# Altium footprint library THU.PcbLib: 477 footprints (part 14 of 30)
Each footprint in its own frame and in the unit in brackets; x right, y up, seen from the top. Pads: shape width x height; smd on the part's side, far side on the other; paste and mask are expansions set on the pad; w line width, h text height; cw(c..) or ccw(c..) is an arc to the next point about the centre after c.
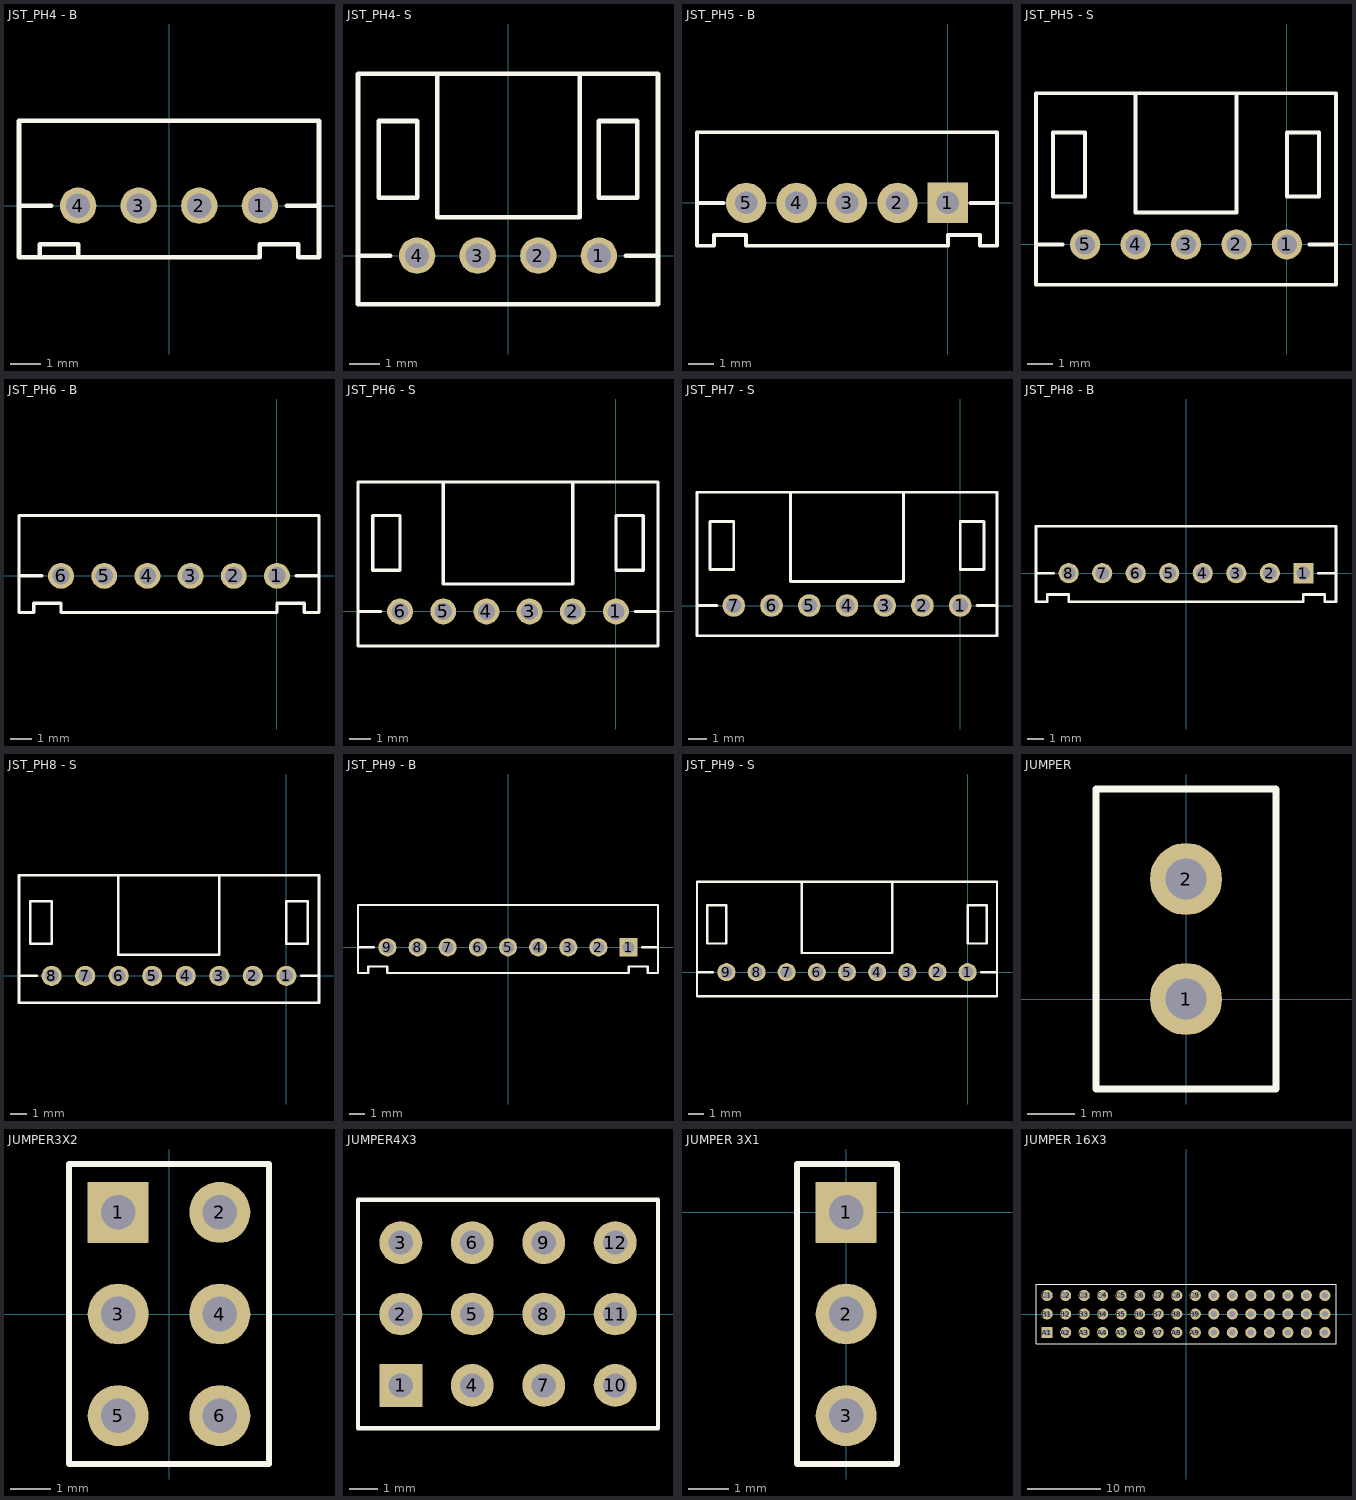
[diagram p13: the footprints below, top view; thin cyan lines are the x and y axes]

## JST_PH4 - B [mm] "B 4B-PH-K-S"
pads (4):
  round 1.2 hole 0.8: 1(3,0) 2(1,0) 3(-1,0) 4(-3,0)
TopOverlay:
  lines w0.152: -4.95,0 -3.889,0 ; -4.27,-1.7 -4.27,-1.27 -3,-1.27 -3,-1.7 ; 3.889,0 4.95,0 ; -4.95,-1.7 3,-1.7 3,-1.27 4.27,-1.27 4.27,-1.7 4.95,-1.7 4.95,2.8 -4.95,2.8 -4.95,-1.7
3D body "B4B-PH-K-S.STEP": height 6, standoff -3.4, extent -4.95,-1.706 4.95,2.794

## JST_PH4- S [mm] "S 4B-PH-K-S"
height 4.5
pads (4):
  round 1.2 hole 0.8: 1(3,0) 2(1,0) 3(-1,0) 4(-3,0)
TopOverlay:
  lines w0.152: -4.95,0 -3.889,0 ; -2.334,6 -2.334,1.27 2.365,1.27 2.365,6 ; 3.889,0 4.95,0 ; -4.95,-1.6 -4.95,6 4.95,6 4.95,-1.6 -4.95,-1.6 ; -4.27,1.905 -3,1.905 -3,4.445 -4.27,4.445 -4.27,1.905 ; 3,1.905 4.27,1.905 4.27,4.445 3,4.445 3,1.905
3D body "S4B-PH-K-S.STEP": height 4.82, standoff -3.37, extent -4.95,-1.35 4.95,6.25

## JST_PH5 - B [mm] "B 5B-PH-K-S"
height 6
pads (5):
  rect 1.6x1.6 hole 0.9: 1(0,0)
  round 1.6 hole 0.9: 2(-2,0) 3(-4,0) 4(-6,0) 5(-8,0)
TopOverlay:
  lines w0.152: -9.95,0 -8.889,0 ; 0.889,0 1.95,0 ; -9.95,-1.7 -9.95,2.8 1.95,2.8 1.95,-1.7 1.27,-1.7 1.27,-1.27 0,-1.27 0,-1.7 -8,-1.7 -8,-1.27 -9.27,-1.27 -9.27,-1.7 -9.95,-1.7
3D body "B5B-PH-K-S.STEP": height 6, standoff -3.4, extent -9.887,-1.727 2.013,2.773

## JST_PH5 - S [mm] "S 5B-PH-K-S"
height 4.8
pads (5):
  round 1.2 hole 0.8: 1(0,0) 2(-2,0) 3(-4,0) 4(-6,0) 5(-8,0)
TopOverlay:
  lines w0.152: -9.95,0 -8.889,0 ; -6,6 -6,1.27 -2,1.27 -2,6 ; 0.889,0 1.95,0 ; -9.95,-1.6 -9.95,6 1.95,6 1.95,-1.6 -9.95,-1.6 ; -9.27,1.905 -9.27,4.445 -8,4.445 -8,1.905 -9.27,1.905 ; 0,1.905 0,4.445 1.27,4.445 1.27,1.905 0,1.905
3D body "S5B-PH-K-S.STEP": height 1.75, standoff -6.45, extent -9.95,-1.35 1.95,6.25

## JST_PH6 - B [mm] "B 6B-PH-K-S"
height 6
pads (6):
  round 1.2 hole 0.8: 1(0,0) 2(-2,0) 3(-4,0) 4(-6,0) 5(-8,0) 6(-10,0)
TopOverlay:
  lines w0.152: -11.95,0 -10.889,0 ; 0.889,0 1.95,0 ; -11.95,-1.7 -11.95,2.8 1.95,2.8 1.95,-1.7 1.27,-1.7 1.27,-1.27 0,-1.27 0,-1.7 -10,-1.7 -10,-1.27 -11.27,-1.27 -11.27,-1.7 -11.95,-1.7
3D body "B6B-PH-K-S.STEP": height 6, standoff -3.4, extent -11.97,-1.702 1.93,2.798

## JST_PH6 - S [mm] "S 6B-PH-K-S"
height 4.8
pads (6):
  round 1.2 hole 0.8: 1(0,0) 2(-2,0) 3(-4,0) 4(-6,0) 5(-8,0) 6(-10,0)
TopOverlay:
  lines w0.152: -11.95,0 -10.889,0 ; -8,6 -8,1.27 -2,1.27 -2,6 ; 0.889,0 1.95,0 ; -11.95,-1.6 -11.95,6 1.95,6 1.95,-1.6 -11.95,-1.6 ; -11.27,1.905 -10,1.905 -10,4.445 -11.27,4.445 -11.27,1.905 ; 0,1.905 1.27,1.905 1.27,4.445 0,4.445 0,1.905
3D body "S6B-PH-K-S.STEP": height 4.84, standoff -3.36, extent -11.954,-1.352 1.946,6.248

## JST_PH7 - S [mm] "S 7B-PH-K-S"
height 4.8
pads (7):
  round 1.2 hole 0.8: 1(0,0) 2(-2,0) 3(-4,0) 4(-6,0) 5(-8,0) 6(-10,0) 7(-12,0)
TopOverlay:
  lines w0.152: -13.95,0 -12.889,0 ; -9,6 -9,1.27 -3,1.27 -3,6 ; 0.889,0 1.95,0 ; -13.95,-1.6 1.95,-1.6 1.95,6 -13.95,6 -13.95,-1.6 ; -13.27,1.905 -12,1.905 -12,4.445 -13.27,4.445 -13.27,1.905 ; 0,1.905 0,4.445 1.27,4.445 1.27,1.905 0,1.905
3D body "S7B-PH-K-S.STEP": height 5.8, standoff -2.4, extent -13.944,-1.346 1.956,6.254

## JST_PH8 - B [mm] "B 8B-PH-K-S"
height 6
pads (8):
  rect 1.2x1.2 hole 0.8: 1(7,0)
  round 1.2 hole 0.8: 2(5,0) 3(3,0) 4(1,0) 5(-1,0) 6(-3,0) 7(-5,0) 8(-7,0)
TopOverlay:
  lines w0.152: -8.95,0 -7.889,0 ; 7.889,0 8.95,0 ; -8.95,-1.7 -8.27,-1.7 -8.27,-1.27 -7,-1.27 -7,-1.7 7,-1.7 7,-1.27 8.27,-1.27 8.27,-1.7 8.95,-1.7 8.95,2.8 -8.95,2.8 -8.95,-1.7

## JST_PH8 - S [mm] "S 8B-PH-K-S"
height 4.8
pads (8):
  round 1.2 hole 0.8: 1(0,0) 2(-2,0) 3(-4,0) 4(-6,0) 5(-8,0) 6(-10,0) 7(-12,0) 8(-14,0)
TopOverlay:
  lines w0.152: -15.95,0 -14.889,0 ; -10.015,6 -10.015,1.27 -4.015,1.27 -4.015,6 ; 0.889,0 1.95,0 ; -15.95,-1.6 -15.95,6 1.95,6 1.95,-1.6 -15.95,-1.6 ; -15.27,1.905 -15.27,4.445 -14,4.445 -14,1.905 -15.27,1.905 ; 0,1.905 1.27,1.905 1.27,4.445 0,4.445 0,1.905
3D body "S8B-PH-K-S.STEP": height 4.85, standoff -3.35, extent -15.96,-1.352 1.94,6.248

## JST_PH9 - B [mm] "B 9B-PH-K-S"
height 6
pads (9):
  rect 1.2x1.2 hole 0.8: 1(8,0)
  round 1.2 hole 0.8: 2(6,0) 3(4,0) 4(2,0) 5(0,0) 6(-2,0) 7(-4,0) 8(-6,0) 9(-8,0)
TopOverlay:
  lines w0.152: -9.95,0 -8.889,0 ; 8.889,0 9.95,0 ; -9.95,-1.7 -9.95,2.8 9.95,2.8 9.95,-1.7 9.27,-1.7 9.27,-1.27 8,-1.27 8,-1.7 -8,-1.7 -8,-1.27 -9.27,-1.27 -9.27,-1.7 -9.95,-1.7

## JST_PH9 - S [mm] "S 9B-PH-K-S"
height 4.8
pads (9):
  round 1.2 hole 0.8: 1(0,0) 2(-2,0) 3(-4,0) 4(-6,0) 5(-8,0) 6(-10,0) 7(-12,0) 8(-14,0) 9(-16,0)
TopOverlay:
  lines w0.152: -17.95,0 -16.889,0 ; -11,6 -11,1.27 -5,1.27 -5,6 ; 0.889,0 1.95,0 ; -17.95,-1.6 -17.95,6 1.95,6 1.95,-1.6 -17.95,-1.6 ; -17.27,1.905 -17.27,4.445 -16,4.445 -16,1.905 -17.27,1.905 ; 0,1.905 1.27,1.905 1.27,4.445 0,4.445 0,1.905
3D body "S9B-PH-K-S.STEP": height 4.85, standoff -3.35, extent -17.959,-1.35 1.941,6.25

## JUMPER [mil]
pads (2):
  round 60 hole 34: 1(0,0) 2(0,100)
TopOverlay:
  lines w6: -75,-75 75,-75 75,175 -75,175 -75,-75
3D body: height 98.43, standoff 0, extent -74.97,-75 75,175
3D body: height 334.65, standoff 0, extent -10.01,-9.99 9.96,9.99
3D body: height 334.65, standoff 0, extent -10.01,90.01 9.96,109.99

## JUMPER3X2 [mil]
pads (6):
  rect 60x60 hole 34: 1(-50,100)
  round 60 hole 34: 2(50,100) 3(-50,0) 4(50,0) 5(-50,-100) 6(50,-100)
TopOverlay:
  lines w6: -98.43,-147.64 -98.43,147.64 98.43,147.64 98.43,-147.64 -98.43,-147.64
3D body: height 98.43, standoff 0, extent -95,-145 95,145
3D body: height 334.65, standoff 0, extent 39.99,-109.99 59.96,-90.01
3D body: height 334.65, standoff 0, extent -60.01,-109.99 -40.04,-90.01
3D body: height 334.65, standoff 0, extent 39.99,-9.99 59.96,9.99
3D body: height 334.65, standoff 0, extent -60.01,-9.99 -40.04,9.99
3D body: height 334.65, standoff 0, extent 39.99,90.01 59.96,109.99
3D body: height 334.65, standoff 0, extent -60.01,90.01 -40.04,109.99

## JUMPER4X3 [mil]
pads (12):
  rect 60x60 hole 34: 1(-750,-100)
  round 60 hole 34: 2(-750,0) 3(-750,100) 4(-650,-100) 5(-650,0) 6(-650,100) 7(-550,-100) 8(-550,0) 9(-550,100) 10(-450,-100) 11(-450,0) 12(-450,100)
TopOverlay:
  lines w6: -810,-160 -390,-160 -390,160 -810,160 -810,-160
3D body: height 98.43, standoff 0, extent -795,-145 -405,145
3D body: height 334.65, standoff 0, extent -759.99,-110.01 -740.01,-90.04
3D body: height 334.65, standoff 0, extent -759.99,-10.01 -740.01,9.96
3D body: height 334.65, standoff 0, extent -759.99,89.99 -740.01,109.96
3D body: height 334.65, standoff 0, extent -659.99,89.99 -640.01,109.96
3D body: height 334.65, standoff 0, extent -659.99,-10.01 -640.01,9.96
3D body: height 334.65, standoff 0, extent -659.99,-110.01 -640.01,-90.04
3D body: height 334.65, standoff 0, extent -559.99,89.99 -540.01,109.96
3D body: height 334.65, standoff 0, extent -559.99,-10.01 -540.01,9.96
3D body: height 334.65, standoff 0, extent -559.99,-110.01 -540.01,-90.04
3D body: height 334.65, standoff 0, extent -459.99,89.99 -440.01,109.96
3D body: height 334.65, standoff 0, extent -459.99,-10.01 -440.01,9.96
3D body: height 334.65, standoff 0, extent -459.99,-110.01 -440.01,-90.04

## JUMPER 3X1 [mil] "3 PIN JUMPER"
height 330.71
pads (3):
  rect 60x60 hole 34: 1(0,0)
  round 60 hole 34: 2(0,-100) 3(0,-200)
TopOverlay:
  lines w6: -48.43,-247.64 50,-247.64 50,47.64 -48.43,47.64 -48.43,-247.64
3D body: height 334.65, standoff 0, extent -10.01,-9.99 9.96,9.99
3D body: height 334.65, standoff 0, extent -10.01,-109.99 9.96,-90.01
3D body: height 334.65, standoff 0, extent -10.01,-209.99 9.96,-190.01
3D body: height 98.43, standoff 0, extent -45,-245 50,45

## JUMPER 16X3 [mil]
pads (48):
  rect 60x60 hole 34: A1(-750,-100)
  round 60 hole 34: A2(-650,-100) A3(-550,-100) A4(-450,-100) A5(-350,-100) A6(-250,-100) A7(-150,-100) A8(-50,-100) A9(50,-100) A10(150,-100) A11(250,-100) A12(350,-100) A13(450,-100) A14(550,-100) A15(650,-100) A16(750,-100) B1(-750,0) B2(-650,0) B3(-550,0) B4(-450,0) B5(-350,0) B6(-250,0) B7(-150,0) B8(-50,0) B9(50,0) B10(150,0) B11(250,0) B12(350,0) B13(450,0) B14(550,0) B15(650,0) B16(750,0) C1(-750,100) C2(-650,100) C3(-550,100) C4(-450,100) C5(-350,100) C6(-250,100) C7(-150,100) C8(-50,100) C9(50,100) C10(150,100) C11(250,100) C12(350,100) C13(450,100) C14(550,100) C15(650,100) C16(750,100)
TopOverlay:
  lines w6: -810,-160 -810,160 810,160 810,-160 -810,-160
3D body: height 334.65, standoff 0, extent 440.01,-110.01 459.99,-90.04
3D body: height 334.65, standoff 0, extent 440.01,-10.01 459.99,9.96
3D body: height 334.65, standoff 0, extent 440.01,89.99 459.99,109.96
3D body: height 334.65, standoff 0, extent 540.01,89.99 559.99,109.96
3D body: height 334.65, standoff 0, extent 540.01,-10.01 559.99,9.96
3D body: height 334.65, standoff 0, extent 540.01,-110.01 559.99,-90.04
3D body: height 334.65, standoff 0, extent 640.01,89.99 659.99,109.96
3D body: height 334.65, standoff 0, extent 640.01,-10.01 659.99,9.96
3D body: height 334.65, standoff 0, extent 640.01,-110.01 659.99,-90.04
3D body: height 334.65, standoff 0, extent 740.01,89.99 759.99,109.96
3D body: height 334.65, standoff 0, extent 740.01,-10.01 759.99,9.96
3D body: height 334.65, standoff 0, extent 740.01,-110.01 759.99,-90.04
3D body: height 334.65, standoff 0, extent 40.01,-110.01 59.99,-90.04
3D body: height 334.65, standoff 0, extent 40.01,-10.01 59.99,9.96
3D body: height 334.65, standoff 0, extent 40.01,89.99 59.99,109.96
3D body: height 334.65, standoff 0, extent 140.01,89.99 159.99,109.96
3D body: height 334.65, standoff 0, extent 140.01,-10.01 159.99,9.96
3D body: height 334.65, standoff 0, extent 140.01,-110.01 159.99,-90.04
3D body: height 334.65, standoff 0, extent 240.01,89.99 259.99,109.96
3D body: height 334.65, standoff 0, extent 240.01,-10.01 259.99,9.96
3D body: height 334.65, standoff 0, extent 240.01,-110.01 259.99,-90.04
3D body: height 334.65, standoff 0, extent 340.01,89.99 359.99,109.96
3D body: height 334.65, standoff 0, extent 340.01,-10.01 359.99,9.96
3D body: height 334.65, standoff 0, extent 340.01,-110.01 359.99,-90.04
3D body: height 334.65, standoff 0, extent -359.99,-110.01 -340.01,-90.04
3D body: height 334.65, standoff 0, extent -359.99,-10.01 -340.01,9.96
3D body: height 334.65, standoff 0, extent -359.99,89.99 -340.01,109.96
3D body: height 334.65, standoff 0, extent -259.99,89.99 -240.01,109.96
3D body: height 334.65, standoff 0, extent -259.99,-10.01 -240.01,9.96
3D body: height 334.65, standoff 0, extent -259.99,-110.01 -240.01,-90.04
3D body: height 334.65, standoff 0, extent -159.99,89.99 -140.01,109.96
3D body: height 334.65, standoff 0, extent -159.99,-10.01 -140.01,9.96
3D body: height 334.65, standoff 0, extent -159.99,-110.01 -140.01,-90.04
3D body: height 334.65, standoff 0, extent -59.99,89.99 -40.01,109.96
3D body: height 334.65, standoff 0, extent -59.99,-10.01 -40.01,9.96
3D body: height 334.65, standoff 0, extent -59.99,-110.01 -40.01,-90.04
3D body: height 334.65, standoff 0, extent -459.99,-110.01 -440.01,-90.04
3D body: height 334.65, standoff 0, extent -459.99,-10.01 -440.01,9.96
3D body: height 334.65, standoff 0, extent -459.99,89.99 -440.01,109.96
3D body: height 334.65, standoff 0, extent -559.99,-110.01 -540.01,-90.04
3D body: height 334.65, standoff 0, extent -559.99,-10.01 -540.01,9.96
3D body: height 334.65, standoff 0, extent -559.99,89.99 -540.01,109.96
3D body: height 334.65, standoff 0, extent -659.99,-110.01 -640.01,-90.04
3D body: height 334.65, standoff 0, extent -659.99,-10.01 -640.01,9.96
3D body: height 334.65, standoff 0, extent -659.99,89.99 -640.01,109.96
3D body: height 334.65, standoff 0, extent -759.99,89.99 -740.01,109.96
3D body: height 334.65, standoff 0, extent -759.99,-10.01 -740.01,9.96
3D body: height 334.65, standoff 0, extent -759.99,-110.01 -740.01,-90.04
3D body: height 334.65, standoff 0, extent -759.99,-110.01 -740.01,-90.04
3D body: height 98.43, standoff 0, extent -800,-145 800,145